# Altium footprint library Molex FFC - FPC Connectors (SMT).PcbLib: 638 footprints (part 34 of 40)
Each footprint in its own frame and in the unit in brackets; x right, y up, seen from the top. Pads: shape width x height; smd on the part's side, far side on the other; paste and mask are expansions set on the pad; w line width, h text height; cw(c..) or ccw(c..) is an arc to the next point about the centre after c.
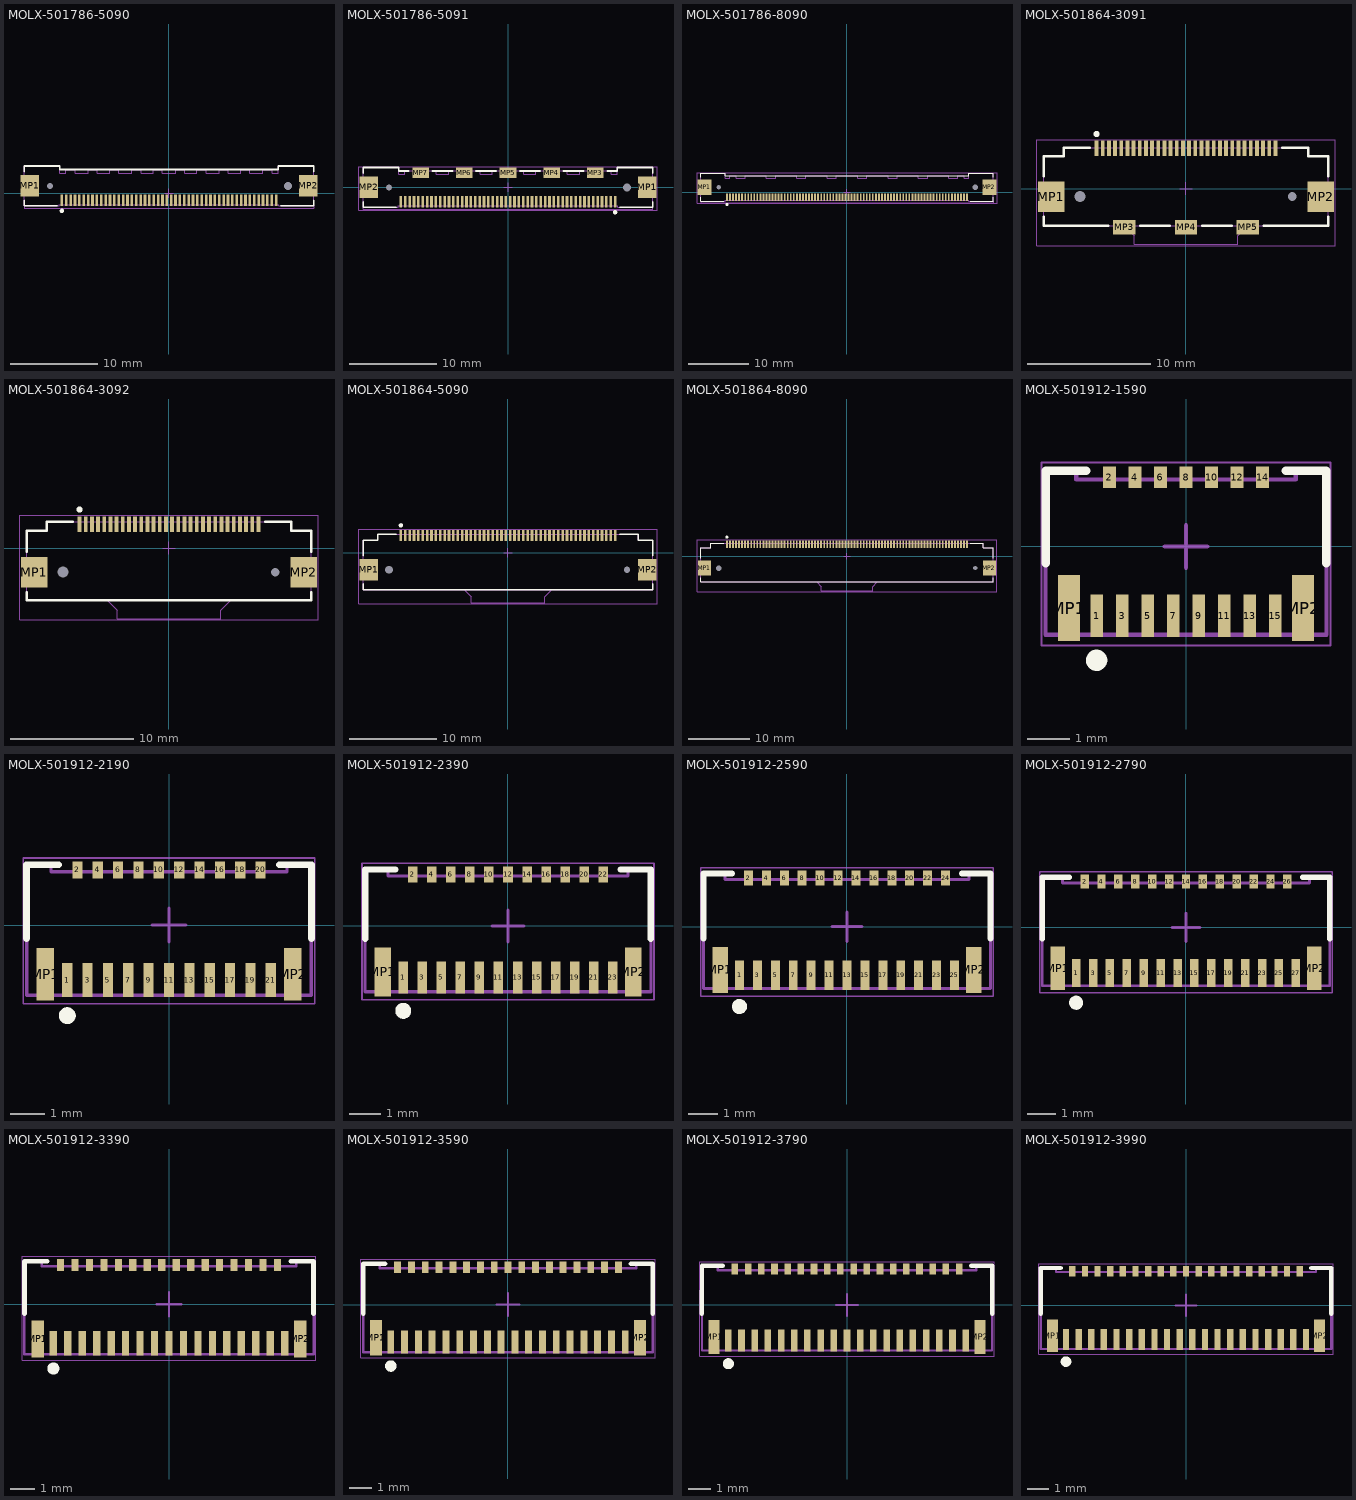
[diagram p33: the footprints below, top view; thin cyan lines are the x and y axes]

## MOLX-501786-5090 [mm] "FFC Connector, 50-Leads, Vertical, Pitch 0.5 mm, Mated Height 8.95 mm, SMT"
height 7.512
pads (54):
  rect 0.3x1.3 smd: 1(-12.25,-0.825) 2(-11.75,-0.825) 3(-11.25,-0.825) 4(-10.75,-0.825) 5(-10.25,-0.825) 6(-9.75,-0.825) 7(-9.25,-0.825) 8(-8.75,-0.825) 9(-8.25,-0.825) 10(-7.75,-0.825) 11(-7.25,-0.825) 12(-6.75,-0.825) 13(-6.25,-0.825) 14(-5.75,-0.825) 15(-5.25,-0.825) 16(-4.75,-0.825) 17(-4.25,-0.825) 18(-3.75,-0.825) 19(-3.25,-0.825) 20(-2.75,-0.825) 21(-2.25,-0.825) 22(-1.75,-0.825) 23(-1.25,-0.825) 24(-0.75,-0.825) 25(-0.25,-0.825) 26(0.25,-0.825) 27(0.75,-0.825) 28(1.25,-0.825) 29(1.75,-0.825) 30(2.25,-0.825) 31(2.75,-0.825) 32(3.25,-0.825) 33(3.75,-0.825) 34(4.25,-0.825) 35(4.75,-0.825) 36(5.25,-0.825) 37(5.75,-0.825) 38(6.25,-0.825) 39(6.75,-0.825) 40(7.25,-0.825) 41(7.75,-0.825) 42(8.25,-0.825) 43(8.75,-0.825) 44(9.25,-0.825) 45(9.75,-0.825) 46(10.25,-0.825) 47(10.75,-0.825) 48(11.25,-0.825) 49(11.75,-0.825) 50(12.25,-0.825)
  round 0.4 hole 0.7 unplated: MH1(-13.6,0.825)
  round 0.6 hole 0.9 unplated: MH2(13.6,0.825)
  rect 2.15x2.47 smd: MP1(-15.925,0.825) MP2(15.925,0.825)
Top Overlay:
  circle w0.25: c-12.25,-2.025 r0.125
  lines w0.2: -16.55,-0.81 -16.55,-1.45 -12.8,-1.45 ; -16.55,2.46 -16.55,3.1 -12.5,3.1 -12.5,2.7 12.5,2.7 12.5,3.1 16.55,3.1 16.55,2.46 ; 12.8,-1.45 16.55,-1.45 16.55,-0.81
Mechanical 13:
  lines w0.1: -16.55,-1.45 -16.55,-1.7 16.55,-1.7 16.55,-1.45 ; 16.55,-1.45 12.55,-1.45 12.55,-1.3 -12.55,-1.3 -12.55,-1.45 -16.55,-1.45 -16.55,3.1 -12.5,3.1 -12.5,2.3 -11.8,2.3 -11.8,2.7 -10.75,2.7 -10.75,2.3 -9.25,2.3 -9.25,2.7 -8.2,2.7 -8.2,2.3 -6.8,2.3 -6.8,2.7 -5.75,2.7 -5.75,2.3 -4.25,2.3 -4.25,2.7 -3.2,2.7 -3.2,2.3 -1.8,2.3 -1.8,2.7 -0.75,2.7 -0.75,2.3 0.75,2.3 0.75,2.7 1.8,2.7 1.8,2.3 3.2,2.3 3.2,2.7 4.25,2.7 4.25,2.3 5.75,2.3 5.75,2.7 6.8,2.7 6.8,2.3 8.2,2.3 8.2,2.7 9.25,2.7 9.25,2.3 10.75,2.3 10.75,2.7 11.8,2.7 11.8,2.3 12.5,2.3 12.5,3.1 16.55,3.1 16.55,-1.45
Mechanical 15:
  lines w0.1: -0.5,0 0.5,0 ; 0,-0.5 0,0.5
3D body: height 0.25, standoff 0, extent -16.55,-1.7 16.55,3.1

## MOLX-501786-5091 [mm] "FFC Connector, 50-Leads, Vertical, Pitch 0.5 mm, Mated Height 8.95 mm, SMT"
height 8.95
pads (59):
  rect 0.3x1.3 smd: 1(12.25,-1.647) 2(11.75,-1.647) 3(11.25,-1.647) 4(10.75,-1.647) 5(10.25,-1.647) 6(9.75,-1.647) 7(9.25,-1.647) 8(8.75,-1.647) 9(8.25,-1.647) 10(7.75,-1.647) 11(7.25,-1.647) 12(6.75,-1.647) 13(6.25,-1.647) 14(5.75,-1.647) 15(5.25,-1.647) 16(4.75,-1.647) 17(4.25,-1.647) 18(3.75,-1.647) 19(3.25,-1.647) 20(2.75,-1.647) 21(2.25,-1.647) 22(1.75,-1.647) 23(1.25,-1.647) 24(0.75,-1.647) 25(0.25,-1.647) 26(-0.25,-1.647) 27(-0.75,-1.647) 28(-1.25,-1.647) 29(-1.75,-1.647) 30(-2.25,-1.647) 31(-2.75,-1.647) 32(-3.25,-1.647) 33(-3.75,-1.647) 34(-4.25,-1.647) 35(-4.75,-1.647) 36(-5.25,-1.647) 37(-5.75,-1.647) 38(-6.25,-1.647) 39(-6.75,-1.647) 40(-7.25,-1.647) 41(-7.75,-1.647) 42(-8.25,-1.647) 43(-8.75,-1.647) 44(-9.25,-1.647) 45(-9.75,-1.647) 46(-10.25,-1.647) 47(-10.75,-1.647) 48(-11.25,-1.647) 49(-11.75,-1.647) 50(-12.25,-1.647)
  round 0.6 hole 0.9 unplated: MH1(13.6,0.002)
  round 0.4 hole 0.7 unplated: MH2(-13.6,0.002)
  rect 2.15x2.47 smd: MP1(15.925,0.002) MP2(-15.925,0.002)
  rect 1.9x1.2 smd: MP3(10,1.647) MP4(5,1.647) MP5(0,1.647) MP6(-5,1.647) MP7(-10,1.647)
Top Overlay:
  circle w0.25: c12.25,-2.848 r0.125
  lines w0.2: -16.55,-1.632 -16.55,-2.272 -12.8,-2.272 ; -16.55,1.638 -16.55,2.278 -12.5,2.278 -12.5,1.877 -11.35,1.877 ; -8.65,1.877 -6.35,1.877 ; -3.65,1.877 -1.35,1.877 ; 1.35,1.877 3.65,1.877 ; 6.35,1.877 8.65,1.877 ; 11.35,1.878 12.5,1.878 12.5,2.278 16.55,2.278 16.55,1.638 ; 12.8,-2.272 16.55,-2.272 16.55,-1.632
Mechanical 13:
  lines w0.1: -16.55,-2.272 -16.55,2.278 -12.5,2.278 -12.5,1.478 -11.8,1.478 -11.8,1.877 -8.2,1.877 -8.2,1.478 -6.8,1.478 -6.8,1.877 -3.2,1.877 -3.2,1.478 -1.8,1.478 -1.8,1.877 1.8,1.877 1.8,1.478 3.2,1.478 3.2,1.877 6.8,1.877 6.8,1.478 8.2,1.478 8.2,1.877 11.8,1.877 11.8,1.478 12.5,1.478 12.5,2.278 16.55,2.278 16.55,-2.272 ; -16.55,-2.272 -16.55,-2.523 16.55,-2.523 16.55,-2.272 ; -16.55,-2.272 -12.55,-2.273 -12.55,-2.123 12.55,-2.123 12.55,-2.273 16.55,-2.272
Mechanical 15:
  lines w0.05: -17.1,-2.622 17.1,-2.622 17.1,2.378 -17.1,2.378 -17.1,-2.622
  lines w0.1: -0.5,0 0.5,0 ; 0,-0.5 0,0.5
3D body: height 0.25, standoff 0, extent -16.55,-2.522 16.55,2.278

## MOLX-501786-8090 [mm] "FFC Connector, 80-Leads, Vertical, Pitch 0.5 mm, Mated Height 8.95 mm, SMT"
height 7.512
pads (84):
  rect 0.3x1.3 smd: 1(-19.75,-0.825) 2(-19.25,-0.825) 3(-18.75,-0.825) 4(-18.25,-0.825) 5(-17.75,-0.825) 6(-17.25,-0.825) 7(-16.75,-0.825) 8(-16.25,-0.825) 9(-15.75,-0.825) 10(-15.25,-0.825) 11(-14.75,-0.825) 12(-14.25,-0.825) 13(-13.75,-0.825) 14(-13.25,-0.825) 15(-12.75,-0.825) 16(-12.25,-0.825) 17(-11.75,-0.825) 18(-11.25,-0.825) 19(-10.75,-0.825) 20(-10.25,-0.825) 21(-9.75,-0.825) 22(-9.25,-0.825) 23(-8.75,-0.825) 24(-8.25,-0.825) 25(-7.75,-0.825) 26(-7.25,-0.825) 27(-6.75,-0.825) 28(-6.25,-0.825) 29(-5.75,-0.825) 30(-5.25,-0.825) 31(-4.75,-0.825) 32(-4.25,-0.825) 33(-3.75,-0.825) 34(-3.25,-0.825) 35(-2.75,-0.825) 36(-2.25,-0.825) 37(-1.75,-0.825) 38(-1.25,-0.825) 39(-0.75,-0.825) 40(-0.25,-0.825) 41(0.25,-0.825) 42(0.75,-0.825) 43(1.25,-0.825) 44(1.75,-0.825) 45(2.25,-0.825) 46(2.75,-0.825) 47(3.25,-0.825) 48(3.75,-0.825) 49(4.25,-0.825) 50(4.75,-0.825) 51(5.25,-0.825) 52(5.75,-0.825) 53(6.25,-0.825) 54(6.75,-0.825) 55(7.25,-0.825) 56(7.75,-0.825) 57(8.25,-0.825) 58(8.75,-0.825) 59(9.25,-0.825) 60(9.75,-0.825) 61(10.25,-0.825) 62(10.75,-0.825) 63(11.25,-0.825) 64(11.75,-0.825) 65(12.25,-0.825) 66(12.75,-0.825) 67(13.25,-0.825) 68(13.75,-0.825) 69(14.25,-0.825) 70(14.75,-0.825) 71(15.25,-0.825) 72(15.75,-0.825) 73(16.25,-0.825) 74(16.75,-0.825) 75(17.25,-0.825) 76(17.75,-0.825) 77(18.25,-0.825) 78(18.75,-0.825) 79(19.25,-0.825) 80(19.75,-0.825)
  round 0.4 hole 0.7 unplated: MH1(-21.1,0.825)
  round 0.6 hole 0.9 unplated: MH2(21.1,0.825)
  rect 2.3x2.47 smd: MP1(-23.425,0.825) MP2(23.425,0.825)
Top Overlay:
  circle w0.25: c-19.75,-2 r0.125
  lines w0.2: -24.05,-0.81 -24.05,-1.45 -20.3,-1.45 ; -24.05,2.46 -24.05,3.1 -20,3.1 -20,2.7 20,2.7 20,3.1 24.05,3.1 24.05,2.46 ; 20.3,-1.45 24.05,-1.45 24.05,-0.81
Mechanical 13:
  lines w0.1: -24.05,-1.45 -24.05,3.1 -20,3.1 -20,2.3 -19.3,2.3 -19.3,2.7 -18.25,2.7 -18.25,2.3 -16.75,2.3 -16.75,2.7 -13.25,2.7 -13.25,2.3 -11.75,2.3 -11.75,2.7 -8.25,2.7 -8.25,2.3 -6.75,2.3 -6.75,2.7 -3.25,2.7 -3.25,2.3 -1.75,2.3 -1.75,2.7 1.75,2.7 1.75,2.3 3.25,2.3 3.25,2.7 6.75,2.7 6.75,2.3 8.25,2.3 8.25,2.7 11.75,2.7 11.75,2.3 13.25,2.3 13.25,2.7 16.75,2.7 16.75,2.3 18.25,2.3 18.25,2.7 19.3,2.7 19.3,2.3 20,2.3 20,3.1 24.05,3.1 24.05,-1.45 ; -24.05,-1.45 -24.05,-1.7 24.05,-1.7 24.05,-1.45 ; -24.05,-1.45 -20.05,-1.45 -20.05,-1.3 20.05,-1.3 20.05,-1.45 24.05,-1.45
Mechanical 15:
  lines w0.05: -24.675,-1.8 -24.675,3.2 24.675,3.2 24.675,-1.8 -24.675,-1.8
  lines w0.1: -0.5,0 0.5,0 ; 0,-0.5 0,0.5
3D body: height 0.25, standoff 0, extent -24.05,-1.7 24.05,3.1

## MOLX-501864-3091 [mm] "FFC Connector, 30-Leads, Right Angle, Pitch 0.5 mm, Mated Height 4.85 mm, SMT"
height 4.85
pads (37):
  rect 0.3x1.25 smd: 1(-7.25,3.248) 2(-6.75,3.248) 3(-6.25,3.248) 4(-5.75,3.248) 5(-5.25,3.248) 6(-4.75,3.248) 7(-4.25,3.248) 8(-3.75,3.248) 9(-3.25,3.248) 10(-2.75,3.248) 11(-2.25,3.248) 12(-1.75,3.248) 13(-1.25,3.248) 14(-0.75,3.248) 15(-0.25,3.248) 16(0.25,3.248) 17(0.75,3.248) 18(1.25,3.248) 19(1.75,3.248) 20(2.25,3.248) 21(2.75,3.248) 22(3.25,3.248) 23(3.75,3.248) 24(4.25,3.248) 25(4.75,3.248) 26(5.25,3.248) 27(5.75,3.248) 28(6.25,3.248) 29(6.75,3.248) 30(7.25,3.248)
  rect 0.6x0.6 hole 0.9 unplated mask+0: MH1(-8.6,-0.652)
  rect 0.4x0.4 hole 0.7 unplated mask+0: MH2(8.6,-0.652)
  rect 2.15x2.47 smd: MP1(-10.925,-0.652) MP2(10.925,-0.652)
  rect 1.8x1.15 smd: MP3(-5,-3.147) MP4(0,-3.147) MP5(5,-3.147)
Top Overlay:
  circle w0.25: c-7.25,4.423 r0.125
  lines w0.2: -11.55,-2.287 -11.55,-3.027 -6.3,-3.027 ; -11.55,0.983 -11.55,2.623 -9.9,2.623 -9.9,3.323 -7.8,3.323 ; -3.7,-3.027 -1.3,-3.027 ; 1.3,-3.027 3.7,-3.027 ; 6.3,-3.027 11.55,-3.027 11.55,-2.287 ; 7.8,3.323 9.9,3.323 9.9,2.623 11.55,2.623 11.55,0.983
Mechanical 13:
  lines w0.1: -5.6,-3.027 -5.6,-3.527 -4.4,-3.527 -4.4,-3.027 ; -5,-3.027 -4.2,-3.827 -4.2,-4.527 4.2,-4.527 4.2,-3.827 5,-3.027 ; -0.6,-3.027 -0.6,-3.527 0.6,-3.527 0.6,-3.027 ; 4.4,-3.027 4.4,-3.527 5.6,-3.527 5.6,-3.027 ; -11.55,-3.027 11.55,-3.027 11.55,2.623 9.9,2.623 9.9,3.323 -9.9,3.323 -9.9,2.623 -11.55,2.623 -11.55,-3.027
Mechanical 15:
  lines w0.05: -12.1,-4.627 -12.1,3.973 12.1,3.973 12.1,-4.627 -12.1,-4.627
  lines w0.1: -0.5,0 0.5,0 ; 0,-0.5 0,0.5
3D body: height 0.25, standoff 0, extent -11.55,-4.528 11.55,3.472

## MOLX-501864-3092 [mm] "FFC Connector, 30-Leads, Right Angle, Pitch 0.5 mm, Mated Height 4.85 mm, SMT"
height 4.85
pads (34):
  rect 0.3x1.25 smd: 1(-7.25,1.95) 2(-6.75,1.95) 3(-6.25,1.95) 4(-5.75,1.95) 5(-5.25,1.95) 6(-4.75,1.95) 7(-4.25,1.95) 8(-3.75,1.95) 9(-3.25,1.95) 10(-2.75,1.95) 11(-2.25,1.95) 12(-1.75,1.95) 13(-1.25,1.95) 14(-0.75,1.95) 15(-0.25,1.95) 16(0.25,1.95) 17(0.75,1.95) 18(1.25,1.95) 19(1.75,1.95) 20(2.25,1.95) 21(2.75,1.95) 22(3.25,1.95) 23(3.75,1.95) 24(4.25,1.95) 25(4.75,1.95) 26(5.25,1.95) 27(5.75,1.95) 28(6.25,1.95) 29(6.75,1.95) 30(7.25,1.95)
  rect 0.6x0.6 hole 0.9 unplated mask+0: MH1(-8.6,-1.95)
  rect 0.4x0.4 hole 0.7 unplated mask+0: MH2(8.6,-1.95)
  rect 2.15x2.47 smd: MP1(-10.925,-1.95) MP2(10.925,-1.95)
Top Overlay:
  circle w0.25: c-7.25,3.125 r0.125
  lines w0.2: -11.55,-3.585 -11.55,-4.225 11.55,-4.225 11.55,-3.585 ; -11.55,-0.315 -11.55,1.425 -9.9,1.425 -9.9,2.125 -7.8,2.125 ; 7.8,2.125 9.9,2.125 9.9,1.425 11.55,1.425 11.55,-0.315
Mechanical 13:
  lines w0.1: -5,-4.225 -4.2,-5.025 -4.2,-5.725 4.2,-5.725 4.2,-5.025 5,-4.225 ; -11.55,-4.225 11.55,-4.225 11.55,1.425 9.9,1.425 9.9,2.125 -9.9,2.125 -9.9,1.425 -11.55,1.425 -11.55,-4.225
Mechanical 15:
  lines w0.05: -12.1,-5.825 -12.1,2.675 12.1,2.675 12.1,-5.825 -12.1,-5.825
  lines w0.1: -0.5,0 0.5,0 ; 0,-0.5 0,0.5
3D body: height 0.25, standoff 0, extent -11.55,-5.725 11.55,2.275

## MOLX-501864-5090 [mm] "FFC Connector, 50-Leads, Right Angle, Pitch 0.5 mm, Mated Height 4.85 mm, SMT"
height 4.85
pads (54):
  rect 0.3x1.25 smd: 1(-12.25,1.95) 2(-11.75,1.95) 3(-11.25,1.95) 4(-10.75,1.95) 5(-10.25,1.95) 6(-9.75,1.95) 7(-9.25,1.95) 8(-8.75,1.95) 9(-8.25,1.95) 10(-7.75,1.95) 11(-7.25,1.95) 12(-6.75,1.95) 13(-6.25,1.95) 14(-5.75,1.95) 15(-5.25,1.95) 16(-4.75,1.95) 17(-4.25,1.95) 18(-3.75,1.95) 19(-3.25,1.95) 20(-2.75,1.95) 21(-2.25,1.95) 22(-1.75,1.95) 23(-1.25,1.95) 24(-0.75,1.95) 25(-0.25,1.95) 26(0.25,1.95) 27(0.75,1.95) 28(1.25,1.95) 29(1.75,1.95) 30(2.25,1.95) 31(2.75,1.95) 32(3.25,1.95) 33(3.75,1.95) 34(4.25,1.95) 35(4.75,1.95) 36(5.25,1.95) 37(5.75,1.95) 38(6.25,1.95) 39(6.75,1.95) 40(7.25,1.95) 41(7.75,1.95) 42(8.25,1.95) 43(8.75,1.95) 44(9.25,1.95) 45(9.75,1.95) 46(10.25,1.95) 47(10.75,1.95) 48(11.25,1.95) 49(11.75,1.95) 50(12.25,1.95)
  rect 0.6x0.6 hole 0.9 unplated mask+0: MH1(-13.6,-1.95)
  rect 0.4x0.4 hole 0.7 unplated mask+0: MH2(13.6,-1.95)
  rect 2.15x2.47 smd: MP1(-15.925,-1.95) MP2(15.925,-1.95)
Top Overlay:
  circle w0.25: c-12.25,3.125 r0.125
  lines w0.2: -16.55,-3.585 -16.55,-4.225 16.55,-4.225 16.55,-3.585 ; -16.55,-0.315 -16.55,1.425 -14.9,1.425 -14.9,2.125 -12.8,2.125 ; 12.8,2.125 14.9,2.125 14.9,1.425 16.55,1.425 16.55,-0.315
Mechanical 13:
  lines w0.1: -5,-4.225 -4.2,-5.025 -4.2,-5.725 4.2,-5.725 4.2,-5.025 5,-4.225 ; -16.55,-4.225 -16.55,1.425 -14.9,1.425 -14.9,2.125 14.9,2.125 14.9,1.425 16.55,1.425 16.55,-4.225 -16.55,-4.225
Mechanical 15:
  lines w0.05: -17.1,-5.825 -17.1,2.675 17.1,2.675 17.1,-5.825 -17.1,-5.825
  lines w0.1: -0.5,0 0.5,0 ; 0,-0.5 0,0.5
3D body: height 0.25, standoff 0, extent -16.55,-5.725 16.55,2.275

## MOLX-501864-8090 [mm] "FFC Connector, 80-Leads, Right Angle, Pitch 0.5 mm, Mated Height 4.85 mm, SMT"
height 4.85
pads (84):
  rect 0.3x1.25 smd: 1(-19.75,1.95) 2(-19.25,1.95) 3(-18.75,1.95) 4(-18.25,1.95) 5(-17.75,1.95) 6(-17.25,1.95) 7(-16.75,1.95) 8(-16.25,1.95) 9(-15.75,1.95) 10(-15.25,1.95) 11(-14.75,1.95) 12(-14.25,1.95) 13(-13.75,1.95) 14(-13.25,1.95) 15(-12.75,1.95) 16(-12.25,1.95) 17(-11.75,1.95) 18(-11.25,1.95) 19(-10.75,1.95) 20(-10.25,1.95) 21(-9.75,1.95) 22(-9.25,1.95) 23(-8.75,1.95) 24(-8.25,1.95) 25(-7.75,1.95) 26(-7.25,1.95) 27(-6.75,1.95) 28(-6.25,1.95) 29(-5.75,1.95) 30(-5.25,1.95) 31(-4.75,1.95) 32(-4.25,1.95) 33(-3.75,1.95) 34(-3.25,1.95) 35(-2.75,1.95) 36(-2.25,1.95) 37(-1.75,1.95) 38(-1.25,1.95) 39(-0.75,1.95) 40(-0.25,1.95) 41(0.25,1.95) 42(0.75,1.95) 43(1.25,1.95) 44(1.75,1.95) 45(2.25,1.95) 46(2.75,1.95) 47(3.25,1.95) 48(3.75,1.95) 49(4.25,1.95) 50(4.75,1.95) 51(5.25,1.95) 52(5.75,1.95) 53(6.25,1.95) 54(6.75,1.95) 55(7.25,1.95) 56(7.75,1.95) 57(8.25,1.95) 58(8.75,1.95) 59(9.25,1.95) 60(9.75,1.95) 61(10.25,1.95) 62(10.75,1.95) 63(11.25,1.95) 64(11.75,1.95) 65(12.25,1.95) 66(12.75,1.95) 67(13.25,1.95) 68(13.75,1.95) 69(14.25,1.95) 70(14.75,1.95) 71(15.25,1.95) 72(15.75,1.95) 73(16.25,1.95) 74(16.75,1.95) 75(17.25,1.95) 76(17.75,1.95) 77(18.25,1.95) 78(18.75,1.95) 79(19.25,1.95) 80(19.75,1.95)
  round 0.6 hole 0.9 unplated: MH1(-21.1,-1.95)
  round 0.4 hole 0.7 unplated: MH2(21.1,-1.95)
  rect 2.15x2.47 smd: MP1(-23.425,-1.95) MP2(23.425,-1.95)
Top Overlay:
  circle w0.25: c-19.75,3.125 r0.125
  lines w0.2: -24.05,-3.585 -24.05,-4.225 24.05,-4.225 24.05,-3.585 ; -24.05,-0.315 -24.05,1.425 -22.4,1.425 -22.4,2.125 -20.3,2.125 ; 20.3,2.125 22.4,2.125 22.4,1.425 24.05,1.425 24.05,-0.315
Mechanical 13:
  lines w0.1: -5,-4.225 -4.2,-5.025 -4.2,-5.725 4.2,-5.725 4.2,-5.025 5,-4.225 ; 22.4,1.425 22.4,2.125 ; 22.4,1.425 24.05,1.425 ; 22.4,1.425 22.4,2.125 ; 22.4,1.425 24.05,1.425 ; 22.4,2.125 -22.4,2.125 -22.4,1.425 -24.05,1.425 -24.05,-4.225 24.05,-4.225 24.05,1.425
Mechanical 15:
  lines w0.05: -24.6,-5.825 -24.6,2.675 24.6,2.675 24.6,-5.825 -24.6,-5.825
  lines w0.1: -0.5,0 0.5,0 ; 0,-0.5 0,0.5
3D body: height 0.25, standoff 0, extent -24.05,-5.725 24.05,2.275

## MOLX-501912-1590 [mm] "FPC Connector, 15-Leads, Right Angle, Pitch 0.3 mm, Mated Height 1.8 mm, SMT"
height 1.812
pads (17):
  rect 0.3x1 smd: 1(-2.1,-1.625) 3(-1.5,-1.625) 5(-0.9,-1.625) 7(-0.3,-1.625) 9(0.3,-1.625) 11(0.9,-1.625) 13(1.5,-1.625) 15(2.1,-1.625)
  rect 0.3x0.5 smd: 2(-1.8,1.625) 4(-1.2,1.625) 6(-0.6,1.625) 8(0,1.625) 10(0.6,1.625) 12(1.2,1.625) 14(1.8,1.625)
  rect 0.52x1.55 smd: MP1(-2.75,-1.45) MP2(2.75,-1.45)
Top Overlay:
  circle w0.25: c-2.1,-2.675 r0.125
  lines w0.2: -3.3,-0.399 -3.3,1.775 -2.35,1.775 ; 2.35,1.775 3.3,1.775 3.3,-0.399
Mechanical 13:
  lines w0.1: 3.3,1.775 3.3,-2.075 -3.3,-2.075 -3.3,1.775 -2.58,1.775 -2.58,1.575 2.58,1.575 2.58,1.775 3.3,1.775
Mechanical 15:
  lines w0.05: -3.4,-2.325 -3.4,1.975 3.4,1.975 3.4,-2.325 -3.4,-2.325
  lines w0.1: -0.5,0 0.5,0 ; 0,-0.5 0,0.5
3D body: height 0.25, standoff 0, extent -3.3,-2.075 3.3,1.775

## MOLX-501912-2190 [mm] "FPC Connector, 21-Leads, Right Angle, Pitch 0.3 mm, Mated Height 1.8 mm, SMT"
height 1.812
pads (23):
  rect 0.3x1 smd: 1(-3,-1.625) 3(-2.4,-1.625) 5(-1.8,-1.625) 7(-1.2,-1.625) 9(-0.6,-1.625) 11(0,-1.625) 13(0.6,-1.625) 15(1.2,-1.625) 17(1.8,-1.625) 19(2.4,-1.625) 21(3,-1.625)
  rect 0.3x0.5 smd: 2(-2.7,1.625) 4(-2.1,1.625) 6(-1.5,1.625) 8(-0.9,1.625) 10(-0.3,1.625) 12(0.3,1.625) 14(0.9,1.625) 16(1.5,1.625) 18(2.1,1.625) 20(2.7,1.625)
  rect 0.52x1.55 smd: MP1(-3.65,-1.45) MP2(3.65,-1.45)
Top Overlay:
  circle w0.25: c-3,-2.675 r0.125
  lines w0.2: -4.2,-0.399 -4.2,1.775 -3.25,1.775 ; 3.25,1.775 4.2,1.775 4.2,-0.399
Mechanical 13:
  lines w0.1: -4.2,-2.075 4.2,-2.075 4.2,1.775 3.48,1.775 3.48,1.575 -3.48,1.575 -3.48,1.775 -4.2,1.775 -4.2,-2.075
Mechanical 15:
  lines w0.05: -4.3,-2.325 -4.3,1.975 4.3,1.975 4.3,-2.325 -4.3,-2.325
  lines w0.1: -0.5,0 0.5,0 ; 0,-0.5 0,0.5
3D body: height 0.25, standoff 0, extent -4.2,-2.075 4.2,1.775

## MOLX-501912-2390 [mm] "FPC Connector, 23-Leads, Right Angle, Pitch 0.3 mm, Mated Height 1.8 mm, SMT"
height 1.812
pads (25):
  rect 0.3x1 smd: 1(-3.3,-1.625) 3(-2.7,-1.625) 5(-2.1,-1.625) 7(-1.5,-1.625) 9(-0.9,-1.625) 11(-0.3,-1.625) 13(0.3,-1.625) 15(0.9,-1.625) 17(1.5,-1.625) 19(2.1,-1.625) 21(2.7,-1.625) 23(3.3,-1.625)
  rect 0.3x0.5 smd: 2(-3,1.625) 4(-2.4,1.625) 6(-1.8,1.625) 8(-1.2,1.625) 10(-0.6,1.625) 12(0,1.625) 14(0.6,1.625) 16(1.2,1.625) 18(1.8,1.625) 20(2.4,1.625) 22(3,1.625)
  rect 0.52x1.55 smd: MP1(-3.95,-1.45) MP2(3.95,-1.45)
Top Overlay:
  circle w0.25: c-3.3,-2.675 r0.125
  lines w0.2: -4.5,-0.399 -4.5,1.775 -3.55,1.775 ; 3.55,1.775 4.5,1.775 4.5,-0.399
Mechanical 13:
  lines w0.1: -4.5,-2.075 -4.5,1.775 -3.78,1.775 -3.78,1.575 3.78,1.575 3.78,1.775 4.5,1.775 4.5,-2.075 -4.5,-2.075
Mechanical 15:
  lines w0.05: -4.6,-2.325 4.6,-2.325 4.6,1.975 -4.6,1.975 -4.6,-2.325
  lines w0.1: -0.5,0 0.5,0 ; 0,-0.5 0,0.5
3D body: height 0.25, standoff 0, extent -4.5,-2.075 4.5,1.775

## MOLX-501912-2590 [mm] "FPC Connector, 25-Leads, Right Angle, Pitch 0.3 mm, Mated Height 1.8 mm, SMT"
height 1.812
pads (27):
  rect 0.3x1 smd: 1(-3.6,-1.625) 3(-3,-1.625) 5(-2.4,-1.625) 7(-1.8,-1.625) 9(-1.2,-1.625) 11(-0.6,-1.625) 13(0,-1.625) 15(0.6,-1.625) 17(1.2,-1.625) 19(1.8,-1.625) 21(2.4,-1.625) 23(3,-1.625) 25(3.6,-1.625)
  rect 0.3x0.5 smd: 2(-3.3,1.625) 4(-2.7,1.625) 6(-2.1,1.625) 8(-1.5,1.625) 10(-0.9,1.625) 12(-0.3,1.625) 14(0.3,1.625) 16(0.9,1.625) 18(1.5,1.625) 20(2.1,1.625) 22(2.7,1.625) 24(3.3,1.625)
  rect 0.52x1.55 smd: MP1(-4.25,-1.45) MP2(4.25,-1.45)
Top Overlay:
  circle w0.25: c-3.6,-2.675 r0.125
  lines w0.2: -4.8,-0.399 -4.8,1.775 -3.85,1.775 ; 3.85,1.775 4.8,1.775 4.8,-0.399
Mechanical 13:
  lines w0.1: -4.8,-2.075 -4.8,1.775 -4.08,1.775 -4.08,1.575 4.08,1.575 4.08,1.775 4.8,1.775 4.8,-2.075 -4.8,-2.075
Mechanical 15:
  lines w0.05: -4.9,-2.325 4.9,-2.325 4.9,1.975 -4.9,1.975 -4.9,-2.325
  lines w0.1: -0.5,0 0.5,0 ; 0,-0.5 0,0.5
3D body: height 0.25, standoff 0, extent -4.8,-2.075 4.8,1.775

## MOLX-501912-2790 [mm] "FPC Connector, 27-Leads, Right Angle, Pitch 0.3 mm, Mated Height 1.8 mm, SMT"
height 1.812
pads (29):
  rect 0.3x1 smd: 1(-3.9,-1.625) 3(-3.3,-1.625) 5(-2.7,-1.625) 7(-2.1,-1.625) 9(-1.5,-1.625) 11(-0.9,-1.625) 13(-0.3,-1.625) 15(0.3,-1.625) 17(0.9,-1.625) 19(1.5,-1.625) 21(2.1,-1.625) 23(2.7,-1.625) 25(3.3,-1.625) 27(3.9,-1.625)
  rect 0.3x0.5 smd: 2(-3.6,1.625) 4(-3,1.625) 6(-2.4,1.625) 8(-1.8,1.625) 10(-1.2,1.625) 12(-0.6,1.625) 14(0,1.625) 16(0.6,1.625) 18(1.2,1.625) 20(1.8,1.625) 22(2.4,1.625) 24(3,1.625) 26(3.6,1.625)
  rect 0.52x1.55 smd: MP1(-4.55,-1.45) MP2(4.55,-1.45)
Top Overlay:
  circle w0.25: c-3.9,-2.675 r0.125
  lines w0.2: -5.1,-0.4 -5.1,1.775 -4.15,1.775 ; 4.15,1.775 5.1,1.775 5.1,-0.4
Mechanical 13:
  lines w0.1: -5.1,-2.075 -5.1,1.775 -4.38,1.775 -4.38,1.575 4.38,1.575 4.38,1.775 5.1,1.775 5.1,-2.075 -5.1,-2.075
Mechanical 15:
  lines w0.05: -5.2,-2.325 5.2,-2.325 5.2,1.975 -5.2,1.975 -5.2,-2.325
  lines w0.1: -0.5,0 0.5,0 ; 0,-0.5 0,0.5
3D body: height 0.25, standoff 0, extent -5.1,-2.075 5.1,1.775

## MOLX-501912-3390 [mm] "FPC Connector, 33-Leads, Right Angle, Pitch 0.3 mm, Mated Height 1.8 mm, SMT"
height 1.812
pads (35):
  rect 0.3x1 smd: 1(-4.8,-1.625) 3(-4.2,-1.625) 5(-3.6,-1.625) 7(-3,-1.625) 9(-2.4,-1.625) 11(-1.8,-1.625) 13(-1.2,-1.625) 15(-0.6,-1.625) 17(0,-1.625) 19(0.6,-1.625) 21(1.2,-1.625) 23(1.8,-1.625) 25(2.4,-1.625) 27(3,-1.625) 29(3.6,-1.625) 31(4.2,-1.625) 33(4.8,-1.625)
  rect 0.3x0.5 smd: 2(-4.5,1.625) 4(-3.9,1.625) 6(-3.3,1.625) 8(-2.7,1.625) 10(-2.1,1.625) 12(-1.5,1.625) 14(-0.9,1.625) 16(-0.3,1.625) 18(0.3,1.625) 20(0.9,1.625) 22(1.5,1.625) 24(2.1,1.625) 26(2.7,1.625) 28(3.3,1.625) 30(3.9,1.625) 32(4.5,1.625)
  rect 0.52x1.55 smd: MP1(-5.45,-1.45) MP2(5.45,-1.45)
Top Overlay:
  circle w0.25: c-4.8,-2.675 r0.125
  lines w0.2: -6,-0.399 -6,1.775 -5.05,1.775 ; 5.05,1.775 6,1.775 6,-0.399
Mechanical 13:
  lines w0.1: 6,1.775 6,-2.075 -6,-2.075 -6,1.775 -5.28,1.775 -5.28,1.575 5.28,1.575 5.28,1.775 6,1.775
Mechanical 15:
  lines w0.05: -6.1,-2.325 6.1,-2.325 6.1,1.975 -6.1,1.975 -6.1,-2.325
  lines w0.1: -0.5,0 0.5,0 ; 0,-0.5 0,0.5
3D body: height 0.25, standoff 0, extent -6,-2.075 6,1.775

## MOLX-501912-3590 [mm] "FPC Connector, 35-Leads, Right Angle, Pitch 0.3 mm, Mated Height 1.8 mm, SMT"
height 1.812
pads (37):
  rect 0.3x1 smd: 1(-5.1,-1.625) 3(-4.5,-1.625) 5(-3.9,-1.625) 7(-3.3,-1.625) 9(-2.7,-1.625) 11(-2.1,-1.625) 13(-1.5,-1.625) 15(-0.9,-1.625) 17(-0.3,-1.625) 19(0.3,-1.625) 21(0.9,-1.625) 23(1.5,-1.625) 25(2.1,-1.625) 27(2.7,-1.625) 29(3.3,-1.625) 31(3.9,-1.625) 33(4.5,-1.625) 35(5.1,-1.625)
  rect 0.3x0.5 smd: 2(-4.8,1.625) 4(-4.2,1.625) 6(-3.6,1.625) 8(-3,1.625) 10(-2.4,1.625) 12(-1.8,1.625) 14(-1.2,1.625) 16(-0.6,1.625) 18(0,1.625) 20(0.6,1.625) 22(1.2,1.625) 24(1.8,1.625) 26(2.4,1.625) 28(3,1.625) 30(3.6,1.625) 32(4.2,1.625) 34(4.8,1.625)
  rect 0.52x1.55 smd: MP1(-5.75,-1.45) MP2(5.75,-1.45)
Top Overlay:
  circle w0.25: c-5.1,-2.675 r0.125
  lines w0.2: -6.3,-0.399 -6.3,1.775 -5.35,1.775 ; 5.35,1.775 6.3,1.775 6.3,-0.399
Mechanical 13:
  lines w0.1: -6.3,-2.075 -6.3,1.775 -5.58,1.775 -5.58,1.575 5.58,1.575 5.58,1.775 6.3,1.775 6.3,-2.075 -6.3,-2.075
Mechanical 15:
  lines w0.05: -6.4,-2.325 -6.4,1.975 6.4,1.975 6.4,-2.325 -6.4,-2.325
  lines w0.1: -0.5,0 0.5,0 ; 0,-0.5 0,0.5
3D body: height 0.25, standoff 0, extent -6.3,-2.075 6.3,1.775

## MOLX-501912-3790 [mm] "FPC Connector, 37-Leads, Right Angle, Pitch 0.3 mm, Mated Height 1.8 mm, SMT"
height 1.812
pads (39):
  rect 0.3x1 smd: 1(-5.4,-1.625) 3(-4.8,-1.625) 5(-4.2,-1.625) 7(-3.6,-1.625) 9(-3,-1.625) 11(-2.4,-1.625) 13(-1.8,-1.625) 15(-1.2,-1.625) 17(-0.6,-1.625) 19(0,-1.625) 21(0.6,-1.625) 23(1.2,-1.625) 25(1.8,-1.625) 27(2.4,-1.625) 29(3,-1.625) 31(3.6,-1.625) 33(4.2,-1.625) 35(4.8,-1.625) 37(5.4,-1.625)
  rect 0.3x0.5 smd: 2(-5.1,1.625) 4(-4.5,1.625) 6(-3.9,1.625) 8(-3.3,1.625) 10(-2.7,1.625) 12(-2.1,1.625) 14(-1.5,1.625) 16(-0.9,1.625) 18(-0.3,1.625) 20(0.3,1.625) 22(0.9,1.625) 24(1.5,1.625) 26(2.1,1.625) 28(2.7,1.625) 30(3.3,1.625) 32(3.9,1.625) 34(4.5,1.625) 36(5.1,1.625)
  rect 0.52x1.55 smd: MP1(-6.05,-1.45) MP2(6.05,-1.45)
Top Overlay:
  circle w0.25: c-5.4,-2.675 r0.125
  lines w0.2: -6.6,-0.399 -6.6,1.775 -5.65,1.775 ; 5.65,1.775 6.6,1.775 6.6,-0.399
Mechanical 13:
  lines w0.1: -6.6,-2.075 6.6,-2.075 6.6,1.775 5.88,1.775 5.88,1.575 -5.88,1.575 -5.88,1.775 -6.6,1.775 -6.6,-2.075
Mechanical 15:
  lines w0.05: -6.7,-2.325 6.7,-2.325 6.7,1.975 -6.7,1.975 -6.7,-2.325
  lines w0.1: -0.5,0 0.5,0 ; 0,-0.5 0,0.5
3D body: height 0.25, standoff 0, extent -6.6,-2.075 6.6,1.775

## MOLX-501912-3990 [mm] "FPC Connector, 39-Leads, Right Angle, Pitch 0.3 mm, Mated Height 1.8 mm, SMT"
height 1.812
pads (41):
  rect 0.3x1 smd: 1(-5.7,-1.625) 3(-5.1,-1.625) 5(-4.5,-1.625) 7(-3.9,-1.625) 9(-3.3,-1.625) 11(-2.7,-1.625) 13(-2.1,-1.625) 15(-1.5,-1.625) 17(-0.9,-1.625) 19(-0.3,-1.625) 21(0.3,-1.625) 23(0.9,-1.625) 25(1.5,-1.625) 27(2.1,-1.625) 29(2.7,-1.625) 31(3.3,-1.625) 33(3.9,-1.625) 35(4.5,-1.625) 37(5.1,-1.625) 39(5.7,-1.625)
  rect 0.3x0.5 smd: 2(-5.4,1.625) 4(-4.8,1.625) 6(-4.2,1.625) 8(-3.6,1.625) 10(-3,1.625) 12(-2.4,1.625) 14(-1.8,1.625) 16(-1.2,1.625) 18(-0.6,1.625) 20(0,1.625) 22(0.6,1.625) 24(1.2,1.625) 26(1.8,1.625) 28(2.4,1.625) 30(3,1.625) 32(3.6,1.625) 34(4.2,1.625) 36(4.8,1.625) 38(5.4,1.625)
  rect 0.52x1.55 smd: MP1(-6.35,-1.45) MP2(6.35,-1.45)
Top Overlay:
  circle w0.25: c-5.7,-2.675 r0.125
  lines w0.2: -6.9,-0.4 -6.9,1.775 -5.95,1.775 ; 5.95,1.775 6.9,1.775 6.9,-0.4
Mechanical 13:
  lines w0.1: -6.9,-2.075 -6.9,1.775 -6.18,1.775 -6.18,1.575 6.18,1.575 6.18,1.775 6.9,1.775 6.9,-2.075 -6.9,-2.075
Mechanical 15:
  lines w0.05: -7,-2.325 7,-2.325 7,1.975 -7,1.975 -7,-2.325
  lines w0.1: -0.5,0 0.5,0 ; 0,-0.5 0,0.5
3D body: height 0.25, standoff 0, extent -6.9,-2.075 6.9,1.775